# Altium footprint library pcb.PcbLib: 397 footprints (part 4 of 25)
Each footprint in its own frame and in the unit in brackets; x right, y up, seen from the top. Pads: shape width x height; smd on the part's side, far side on the other; paste and mask are expansions set on the pad; w line width, h text height; cw(c..) or ccw(c..) is an arc to the next point about the centre after c.
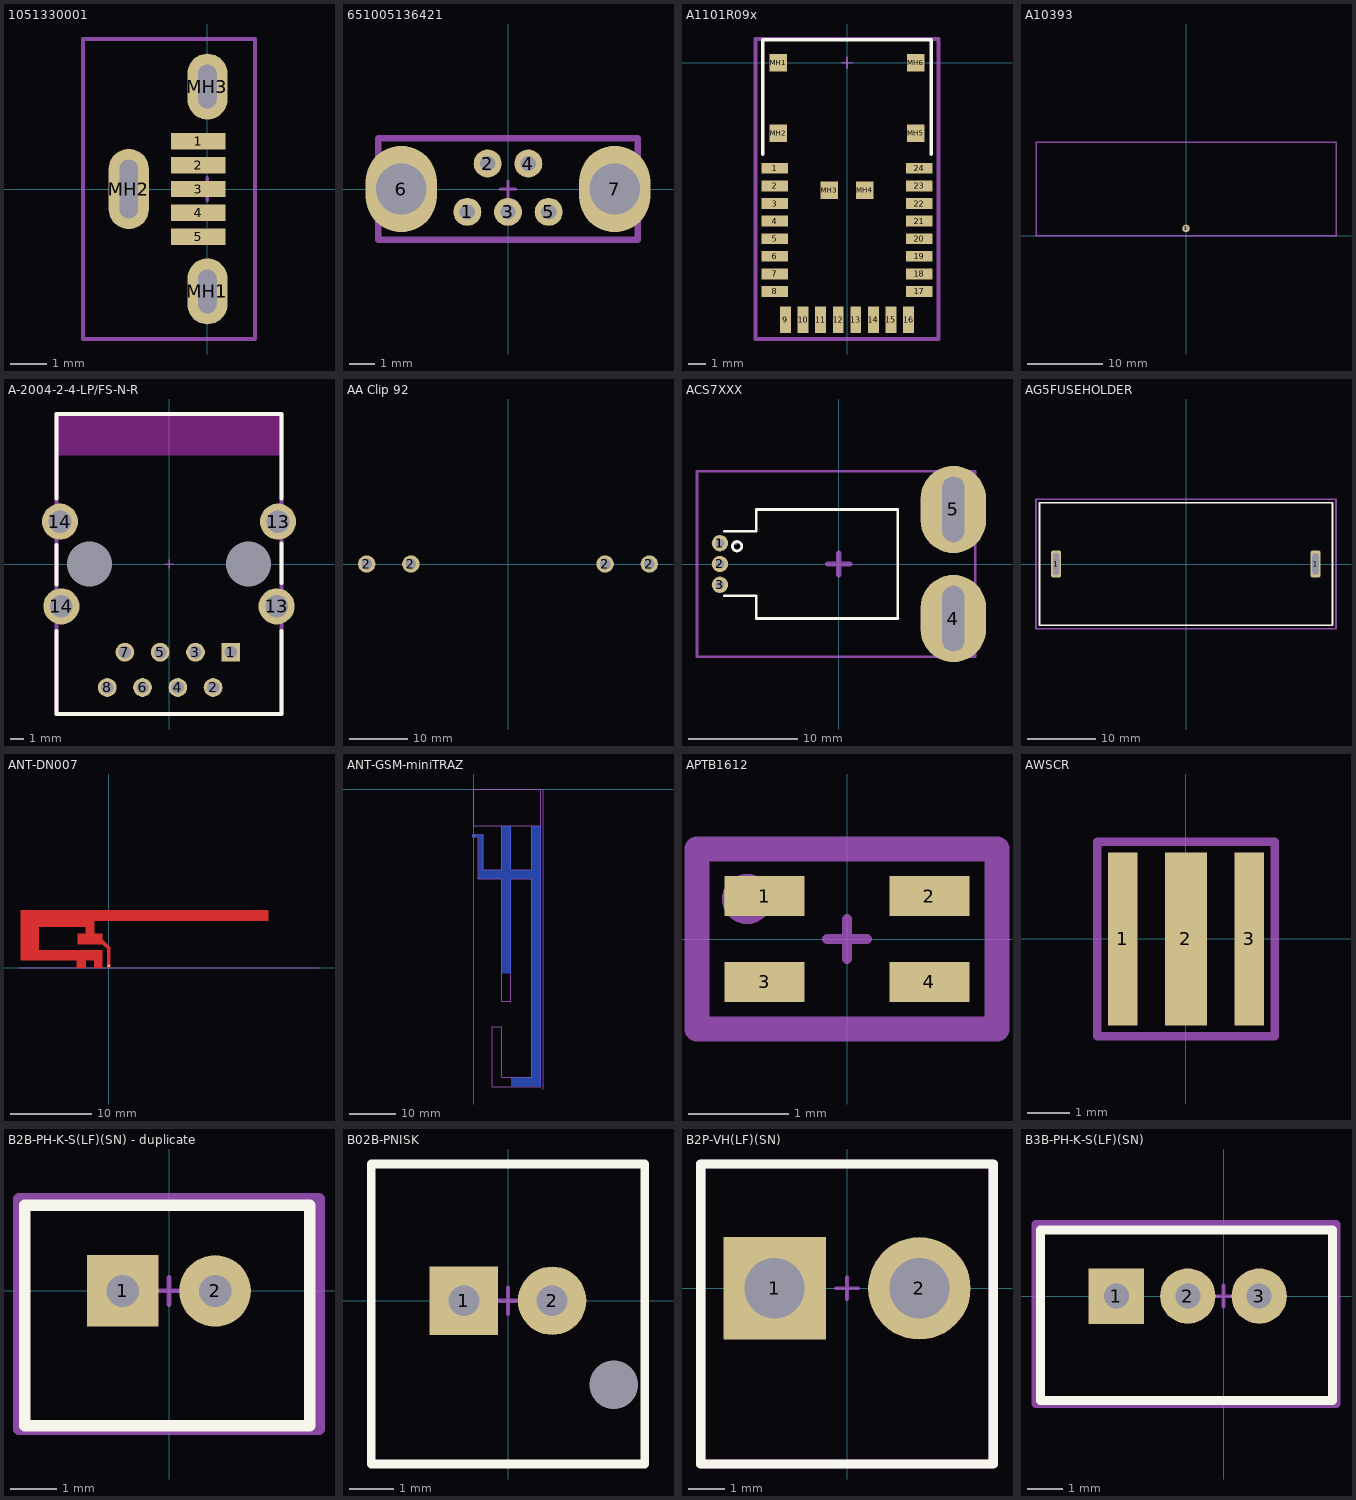
[diagram p3: the footprints below, top view; thin cyan lines are the x and y axes]

## 1051330001 [mm] "Connector; Micro USB Type B; 5 Position; Vertical"
height 6.2
pads (8):
  rect 1.5x0.45 smd: 1(-0.25,1.3) 2(-0.25,0.65) 3(-0.25,0) 4(-0.25,-0.65) 5(-0.25,-1.3)
  oval 1.1x1.8 hole 0.5 slot 1.2 at 90 deg: MH1(0,-2.8) MH3(0,2.8)
  oval 1.1x2.2 hole 0.5 slot 1.6 at 90 deg: MH2(-2.15,0)
Mechanical 15:
  lines w0.1: -0.3,0 0.3,0 ; 0,-0.3 0,0.3 ; -3.4,-4.1 -3.4,4.1 1.3,4.1 1.3,-4.1 -3.4,-4.1
  text ".Designator" at -3,-3.4 h1.02
3D body "1051330001.stp": height 7.43, standoff -2.37, extent -3.3,-4.013 1.15,4.012

## 651005136421 [mm] "VERTICAL MINI USB 2.0 TYPE B 5 CONTACTS"
height 9.2
pads (7):
  round 1.1 hole 0.6: 1(-1.6,-0.9) 2(-0.8,1) 3(0,-0.9) 4(0.8,1) 5(1.6,-0.9)
  oval 2.8x3.4 hole 2: 6(-4.2,0) 7(4.2,0)
Mechanical 15:
  lines w0.1: -0.3,0 0.3,0 ; 0,-0.3 0,0.3
  lines w0.254: -5.1,-2 5.1,-2 5.1,2 -5.1,2 -5.1,-2
  text ".Designator" at -4.5,-1.5 h1.02
3D body "651005136421.stp": height 9.2, standoff -2.8, extent -5.099,-1.95 5.098,1.95

## A1101R09x [mm]
height 1.8
pads (30):
  rect 1.5x0.61 smd: 1(-4.11,-6) 2(-4.11,-7) 3(-4.11,-8) 4(-4.11,-9) 5(-4.11,-10) 6(-4.11,-11) 7(-4.11,-12) 8(-4.11,-13) 17(4.11,-13) 18(4.11,-12) 19(4.11,-11) 20(4.11,-10) 21(4.11,-9) 22(4.11,-8) 23(4.11,-7) 24(4.11,-6)
  rect 0.61x1.5 smd: 9(-3.5,-14.6) 10(-2.5,-14.6) 11(-1.5,-14.6) 12(-0.5,-14.6) 13(0.5,-14.6) 14(1.5,-14.6) 15(2.5,-14.6) 16(3.5,-14.6)
  rect 1x1 smd: MH1(-3.91,0) MH2(-3.91,-4) MH3(-1,-7.25) MH4(1,-7.25) MH5(3.91,-4) MH6(3.91,0)
Top Overlay:
  lines w0.2: -4.8,-5.2 -4.8,1.3 4.8,1.3 4.8,-5.2
Mechanical 15:
  lines w0.1: -0.3,0 0.3,0 ; 0,-0.3 0,0.3
  lines w0.254: -5.2,-15.7 5.2,-15.7 5.2,1.35 -5.2,1.35 -5.2,-15.7
  text ".Designator" at -1,-13.6 h1.02
3D body "Radio Module_R08A_R09A_for Website.stp": height 1.87, standoff -0.02, extent -4.651,-15.126 4.6,1.126

## A10393 [mm]
pads (1):
  round 1 hole 0.5: 1(0,1)
Mechanical 15:
  lines w0.2: -20,0 20,0 20,12.5 -20,12.5 -20,0
3D body: height 1, standoff 0, extent -20,2.5 20,12.5

## A-2004-2-4-LP/FS-N-R [mm]
height 13.8
pads (14):
  rect 1.35x1.35 hole 0.89: 1(4.445,-6.35)
  round 1.35 hole 0.89: 2(3.175,-8.89) 3(1.905,-6.35) 4(0.635,-8.89) 5(-0.635,-6.35) 6(-1.905,-8.89) 7(-3.175,-6.35) 8(-4.445,-8.89)
  round 2.6 hole 1.63: 13(7.75,-3.05) 13(7.85,3.05) 14(-7.85,3.05) 14(-7.75,-3.05)
  round 0 hole 3.25 unplated: ""(-5.715,0) ""(5.715,0)
Top Layer keep-out:
  region: 8.1,10.8 -8.1,10.8 -8.1,7.8 8.1,7.8
Top Overlay:
  lines w0.254: -8.1,-4.82 -8.1,-10.8 8.1,-10.8 8.1,-4.82 ; -8.1,-1.5 -8.1,1.4 ; -8.1,4.7 -8.1,10.8 8.1,10.8 8.1,4.7 ; 8.1,-1.4 8.1,1.5
Mechanical 15:
  lines w0.1: -0.3,0 0.3,0 ; 0,-0.3 0,0.3
  lines w0.254: -8.1,-10.8 8.1,-10.8 8.1,10.8 -8.1,10.8 -8.1,-10.8
  text ".Designator" at -5.1,-4.5 h1.02

## AA Clip 92 [mm]
pads (4):
  round 3 hole 1.85: 2(-24.385,0) 2(-16.765,0) 2(16.765,0) 2(24.385,0)
3D body "AA_battery_clip_92.STEP": height 15.35, standoff -4.01, extent -26.124,-7.675 -16.6,7.525
3D body "AA_battery_clip_92.STEP": height 15.35, standoff -4.01, extent 16.8,-7.55 26.325,7.65

## ACS7XXX [mm] "THROUGH HOLE CURRENT SENSOR FOOTPRINT"
height 7
pads (6):
  round 1.5 hole 0.8: 1(-10.9,1.91) 1(-10.9,1.91) 2(-10.9,0) 3(-10.9,-1.91)
  oval 6x8 hole 2 slot 6 at 90 deg: 4(10.5,-5) 5(10.5,5)
Top Overlay:
  circle w0.254: c-9.325,1.625 r0.426
  lines w0.254: -10.5,-2.9 -7.6,-2.9 ; -10.5,3 -7.6,3 -7.575,3 -7.575,5 5.4,5 5.4,-5 5.425,-5 -7.57,-5 ; -7.575,-4.9 -7.575,-2.9
Mechanical 15:
  lines w0.254: -13,-8.5 -13,8.5 12.5,8.5 12.5,-8.5 -13,-8.5
  lines w0.3: -9.5,1.9 ccw(c-9.5,2) -9.4,2
  lines w0.5: -1,0 1,0 ; 0,-1 0,1
  text ".Designator" at -5.1,-6 h1.02
3D body "User Library-ACS758.STEP": height 7.1, standoff -3.52, extent -11.454,-7 11.3,7

## AG5FUSEHOLDER [mm] "Fuseholder for AG5 fuse, 5x38mm"
pads (2):
  rrect50% 1.5x4 hole 0.9 slot 3.2 at 90 deg: 1(-19.05,0) 1(19,0)
Top Overlay:
  lines w0.254: -21.5,-9 -21.5,9 21.5,9 21.5,-9 -21.5,-9
Mechanical 15:
  lines w0.254: -22,-9.5 22,-9.5 22,9.5 -22,9.5 -22,-9.5
  text ".Designator" at -5.1,-3.5 h1.02
3D body: height 18, standoff 0, extent -21.5,-9.07 21.5,9.07

## ANT-DN007 [mm]
pads (1):
  rect 0.3x0.3 smd paste-100 mask-100: 1(0,0.2)
Top Layer:
  region: -10.77,7.01 19.6,7.01 19.6,5.773 -1.787,5.773 -1.787,4.173 -0.787,4.173 -0.787,3.487 0.2,2.5 0.2,0 -0.2,0 -0.2,2.286 -0.787,2.873 -3.787,2.873 -3.787,4.173 -2.787,4.173 -2.787,5 -8.6,5 -8.6,2.134 -0.787,2.134 -0.787,0 -1.787,0 -1.787,0.873 -2.787,0.873 -2.787,0 -3.937,0 -3.937,0.873 -10.77,0.873
Top Solder:
  region: 9.8,4 9.8,5 9.4,5 9.4,4
  region: 19.8,4 19.8,5 19.4,5 19.4,4
  region: 10.8,4 10.8,5 10.4,5 10.4,4
  region: 11.8,4 11.8,5 11.4,5 11.4,4
  region: 12.8,4 12.8,5 12.4,5 12.4,4
  region: 13.8,4 13.8,5 13.4,5 13.4,4
  region: 14.8,3 14.8,5 14.4,5 14.4,3
  region: 15.8,4 15.8,5 15.4,5 15.4,4
  region: 16.8,4 16.8,5 16.4,5 16.4,4
  region: 17.8,4 17.8,5 17.4,5 17.4,4
  region: 18.8,4 18.8,5 18.4,5 18.4,4
Mechanical 15:
  lines w0.1: -11,0 25.8,0
  text "ground" at 1.2,0.1 h0.5

## ANT-GSM-miniTRAZ [mm]
pads (1):
  rect 0.4x0.4 smd far side mask-1: 1(0,-10.1)
Bottom Layer:
  rectangle: 12.5,-64.5 14.5,-8
  rectangle: 8,-64.5 12.5,-62.5
  rectangle: 6,-40 8,-8
  rectangle: 1,-19.5 12.5,-17.5
  rectangle: 1,-17.5 2,-9.9
  rectangle: 0.2,-10.3 1,-9.9
Bottom Solder:
  rectangle: 2,-52.7 3,-52.3
  rectangle: 2,-53.7 3,-53.3
  rectangle: 2,-54.7 3,-54.3
  rectangle: 2,-55.7 3,-55.3
  rectangle: 2,-56.7 3,-56.3
  rectangle: 2,-57.7 3,-57.3
  rectangle: 2,-58.7 3,-58.3
  rectangle: 1,-59.7 3,-59.3
  rectangle: 2,-60.7 3,-60.3
  rectangle: 2,-61.7 3,-61.3
  rectangle: 2,-62.7 3,-62.3
  rectangle: 2,-63.7 3,-63.3
  rectangle: 4,-35.2 5,-34.8
  rectangle: 4,-45.2 5,-44.8
  rectangle: 4,-36.2 5,-35.8
  rectangle: 4,-37.2 5,-36.8
  rectangle: 4,-38.2 5,-37.8
  rectangle: 4,-39.2 5,-38.8
  rectangle: 3,-40.2 5,-39.8
  rectangle: 4,-41.2 5,-40.8
  rectangle: 4,-42.2 5,-41.8
  rectangle: 4,-43.2 5,-42.8
  rectangle: 4,-44.2 5,-43.8
  region: 6.8,-60.5 6.8,-61.5 7.2,-61.5 7.2,-60.5
  region: 7.8,-60.5 7.8,-61.5 8.2,-61.5 8.2,-60.5
  region: 8.8,-60.5 8.8,-61.5 9.2,-61.5 9.2,-60.5
  region: 9.8,-60.5 9.8,-61.5 10.2,-61.5 10.2,-60.5
  region: 10.8,-60.5 10.8,-61.5 11.2,-61.5 11.2,-60.5
Mechanical 15:
  lines w0.1: 0,-8 14.5,-8 ; 14.5,-8 14.5,-64.5 4,-64.5 4,-51.5 6,-51.5 6,-62.5 12.5,-62.5 12.5,-19.6 12.5,-19.5 8,-19.5 8,-46 6,-46 6,-19.5 1,-19.5 1,-10.3 -0.2,-10.3 -0.2,-9.9 2,-9.9 2,-17.5 6,-17.5 6,-8 8,-8 8,-17.5 12.5,-17.5 12.5,-8 14.5,-8
  lines w0.127: 0,-8 0,0 14.5,0 14.5,-8 ; 15,-65 15,0

## APTB1612 [mm] "Dual LED"
height 0.65
pads (4):
  rect 0.8x0.4 smd: 1(-0.825,0.43) 2(0.825,0.43) 3(-0.825,-0.43) 4(0.825,-0.43)
Mechanical 15:
  circle w0.3: c-1,0.4 r0.1
  lines w0.1: -0.2,0 0.2,0 ; 0,-0.2 0,0.2
  lines w0.254: -1.5,-0.9 1.5,-0.9 1.5,0.9 -1.5,0.9 -1.5,-0.9
  text ".Designator" at -1.5,-2.1 h1.02
3D body: height 0.65, standoff 0, extent -0.8,-0.7 0.8,0.7

## AWSCR [mm]
height 1.2
pads (3):
  rect 0.7x4.1 smd: 1(-1.5,0) 3(1.5,0)
  rect 1x4.1 smd: 2(0,0)
Mechanical 15:
  lines w0.1: -0.3,0 0.3,0 ; 0,-0.3 0,0.3
  lines w0.2: -2.1,-2.3 2.1,-2.3 2.1,2.3 -2.1,2.3 -2.1,-2.3
  text ".Designator" at -1.575,-1.524 h1.02
3D body: height 1.2, standoff 0, extent -1.9,-1.6 1.9,1.6

## B2B-PH-K-S(LF)(SN) - duplicate [mm]
height 2.38
pads (2):
  rect 1.55x1.55 hole 0.7: 1(-1,0)
  round 1.55 hole 0.7: 2(1,0)
Top Overlay:
  lines w0.254: -3.124,-2.921 3.048,-2.921 3.048,1.854 -3.124,1.854 -3.124,-2.921
Mechanical 15:
  lines w0.1: -0.3,0 0.3,0 ; 0,-0.3 0,0.3
  lines w0.254: -3.25,-3 3.25,-3 3.25,2 -3.25,2 -3.25,-3
  text ".Designator" at -2.75,-2 h1.02
3D body "B2B-PH-K-S.STEP": height 6, standoff -3.4, extent -3.001,-2.773 2.899,1.727

## B02B-PNISK [mm]
height 10.2
pads (3):
  rect 1.55x1.55 hole 0.7: 1(-1,0)
  round 1.55 hole 0.7: 2(1,0)
  round 0 hole 1.1 unplated: M(2.4,-1.9)
Top Overlay:
  lines w0.2: -3.1,-3.7 3.1,-3.7 3.1,3.1 -3.1,3.1 -3.1,-3.7
Mechanical 15:
  lines w0.1: -0.3,0 0.3,0 ; 0,-0.3 0,0.3 ; -3.1,-3.7 -3.1,3.1 3.1,3.1 3.1,-3.7 -3.1,-3.7
  text ".Designator" at -2.8,-3.4 h1.02
3D body "B02B-PNISK-1A.STEP": height 10.2, standoff -3.4, extent -3,-3.575 3,2.975

## B2P-VH(LF)(SN) [mm]
height 7.8
pads (2):
  rect 2.8x2.8 hole 1.65: 1(-1.98,0)
  round 2.8 hole 1.65: 2(1.98,0)
Top Overlay:
  lines w0.254: -4,-4.8 -4,3.4 4,3.4 4,-4.8 -4,-4.8
Mechanical 15:
  lines w0.1: -0.3,0 0.3,0 ; 0,-0.3 0,0.3
  lines w0.254: -4,-4.8 -4,3.4 4,3.4 4,-4.8 -4,-4.8
  text "1" at -3.403,-2.781 h1.02
  text ".Designator" at -3.2,-4 h1.02
3D body "B2P-VH.STEP": height 10.9, standoff -3.7, extent -3.9,-4.7 3.96,3.8

## B3B-PH-K-S(LF)(SN) [mm]
height 2.38
pads (3):
  rect 1.55x1.55 hole 0.7: 1(-3,0)
  round 1.55 hole 0.7: 2(-1,0) 3(1,0)
Top Overlay:
  lines w0.254: -5.124,-2.921 3.048,-2.921 3.048,1.854 -5.124,1.854 -5.124,-2.921
Mechanical 15:
  lines w0.1: -0.3,0 0.3,0 ; 0,-0.3 0,0.3
  lines w0.254: -5.25,-3 3.15,-3 3.15,2 -5.25,2 -5.25,-3
  text ".Designator" at -4.572,-2.286 h1.02
3D body "B3B-PH-K-S.STEP": height 6, standoff -3.4, extent -4.966,-2.794 2.934,1.706